# Altium footprint library myPcb.PcbLib: 80 footprints (part 3 of 5)
Each footprint in its own frame and in the unit in brackets; x right, y up, seen from the top. Pads: shape width x height; smd on the part's side, far side on the other; paste and mask are expansions set on the pad; w line width, h text height; cw(c..) or ccw(c..) is an arc to the next point about the centre after c.
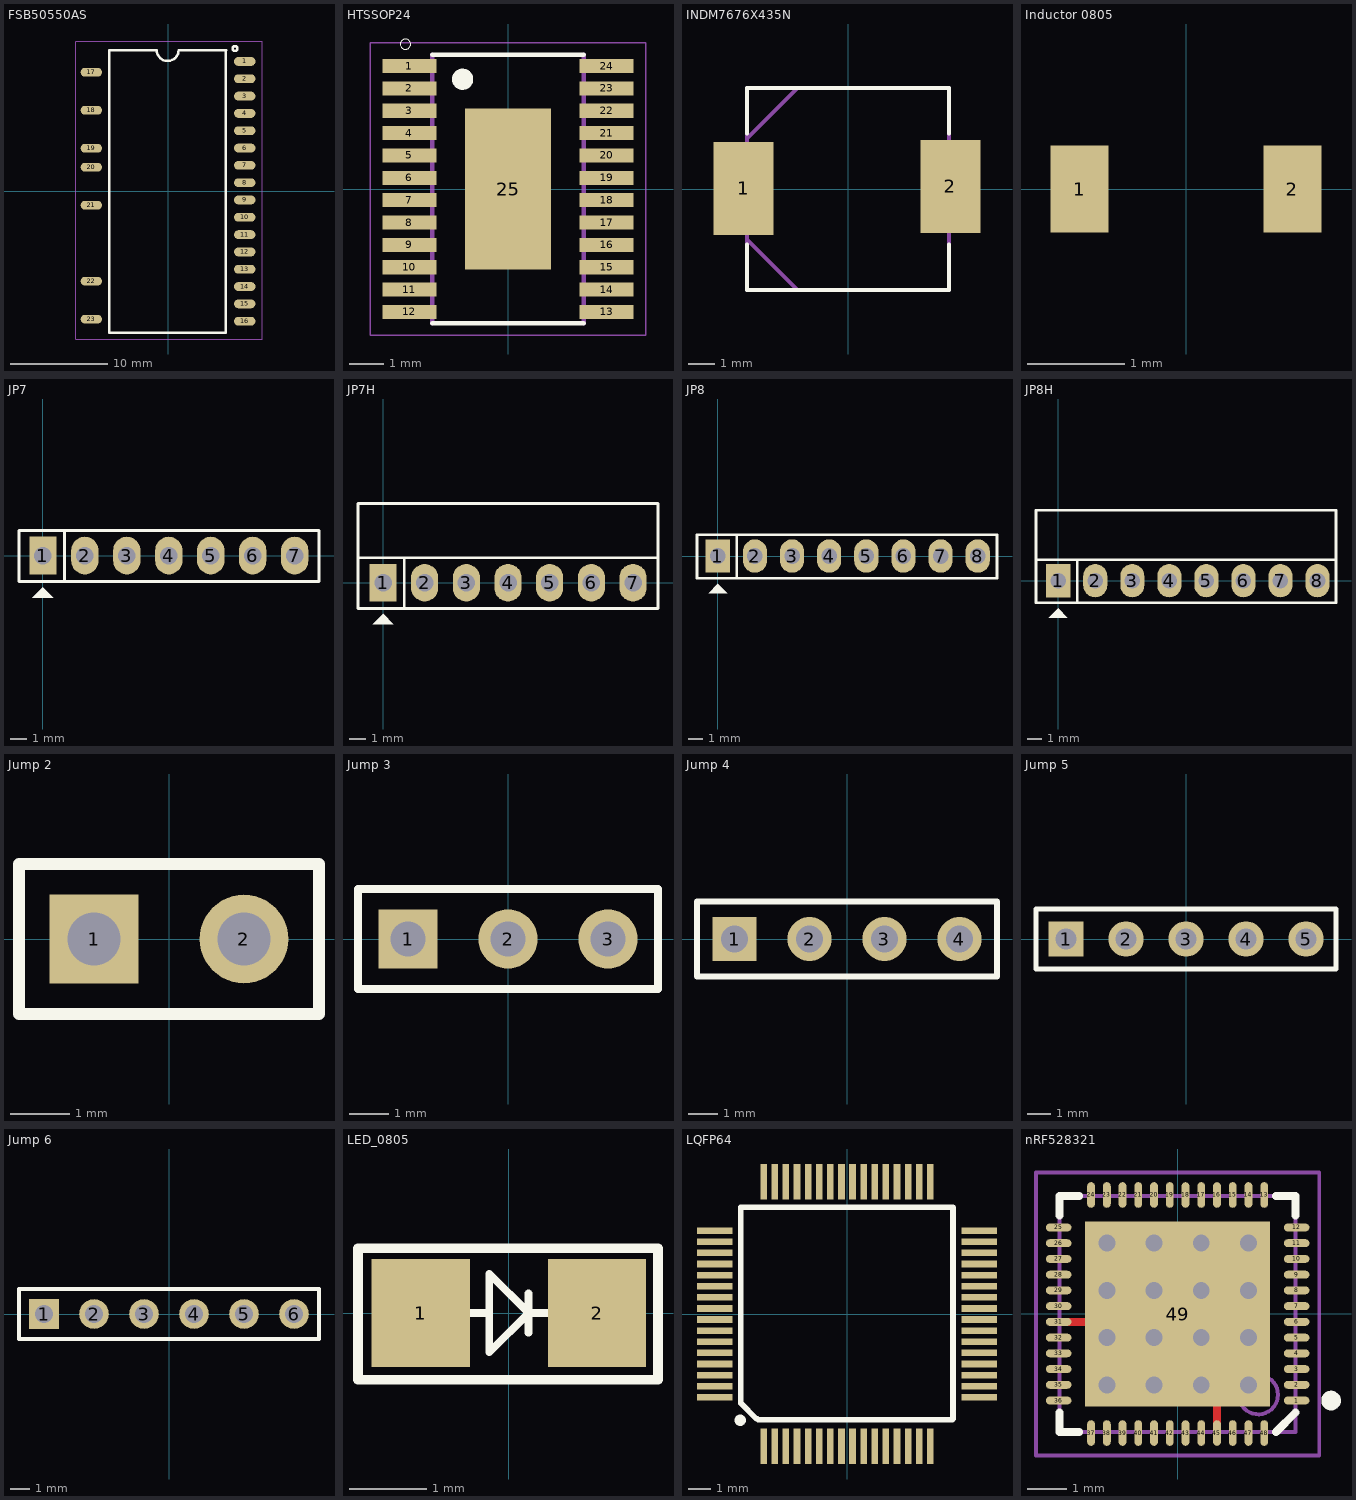
[diagram p2: the footprints below, top view; thin cyan lines are the x and y axes]

## FSB50550AS [mm]
pads (23):
  oval 2.2x0.9 smd: 1(7.874,13.335) 2(7.874,11.557) 3(7.874,9.779) 4(7.874,8.001) 5(7.874,6.223) 6(7.874,4.445) 7(7.874,2.667) 8(7.874,0.889) 9(7.874,-0.889) 10(7.874,-2.667) 11(7.874,-4.445) 12(7.874,-6.223) 13(7.874,-8.001) 14(7.874,-9.779) 15(7.874,-11.557) 16(7.874,-13.335) 17(-7.874,12.225) 18(-7.874,8.325) 19(-7.874,4.425) 20(-7.874,2.475) 21(-7.874,-1.425) 22(-7.874,-9.225) 23(-7.874,-13.125)
Top Overlay:
  circle w0.254: c6.879,14.66 r0.252
  lines w0.254: -6.051,14.5 -6.051,-14.5 5.949,-14.5 5.949,14.5 ; -6.051,14.51 -1.171,14.51 ; -1.161,14.5 ccw(c-0.036,14.516) 1.089,14.51 5.969,14.51
Mechanical 15:
  lines w0.1: -9.22,15.392 -9.423,15.392 ; -9.423,15.392 -9.449,15.367 -9.449,-15.164 9.652,-15.164 9.652,15.392 -8.788,15.392 -9.423,15.392
3D body: height 3.51, standoff -0.19, extent -8.499,-14.522 8.448,14.478

## HTSSOP24 [mm] "https://www.snapeda.com"
pads (25):
  rect 1.57x0.41 smd: 1(-2.87,3.575) 2(-2.87,2.925) 3(-2.87,2.275) 4(-2.87,1.625) 5(-2.87,0.975) 6(-2.87,0.325) 7(-2.87,-0.325) 8(-2.87,-0.975) 9(-2.87,-1.625) 10(-2.87,-2.275) 11(-2.87,-2.925) 12(-2.87,-3.575) 13(2.87,-3.575) 14(2.87,-2.925) 15(2.87,-2.275) 16(2.87,-1.625) 17(2.87,-0.975) 18(2.87,-0.325) 19(2.87,0.325) 20(2.87,0.975) 21(2.87,1.625) 22(2.87,2.275) 23(2.87,2.925) 24(2.87,3.575)
  rect 2.5x4.68 smd: 25(0,0)
Top Overlay:
  circle w0.127: c-1.32,3.19 r0.156
  circle w0.127: c-1.32,3.19 r0.11
  circle w0.127: c-1.43,3.19 r0.11
  circle w0.127: c-1.43,3.19 r0.11
  circle w0.127: c-1.32,3.19 r0.246
  circle w0: c-2.98,4.21 r0.15
  lines w0.127: -2.2,-3.9 2.2,-3.9 ; -2.2,3.9 2.2,3.9
Top Paste:
  region: -0.11,0.16 -1.15,0.16 -1.15,1.11 -0.11,1.11
  region: 0.16,-0.11 0.79,-0.11 0.79,-1.612 0.16,-1.612
  region: -1.148,-0.11 -0.11,-0.11 -0.11,-1.613 -1.148,-1.613
  region: 0.16,1.11 0.79,1.11 0.79,0.16 0.16,0.16
Mechanical 1:
  lines w0.05: -4,-4.25 4,-4.25 4,4.25 -4,4.25 -4,-4.25
  lines w0.127: -2.2,-3.9 -2.2,3.9 ; 2.2,-3.9 2.2,3.9
3D body: height 1.06, standoff -0.14, extent -3.278,-3.95 3.278,3.95

## INDM7676X435N [mil]
pads (2):
  rect 89x138 smd: 1(-155,1) 2(152,4)
Top Overlay:
  lines w6: -150,-82 -150,-150 150,-150 150,-82 ; -150,82 -150,150 150,150 150,82
Mechanical 1:
  lines w6: -150,-75 -75,-150 ; -150,75 -75,150 ; -150,-150 150,-150 150,150 -150,150 -150,-150
3D body: height 118.59, standoff -21.17, extent -148.61,-148.21 150.61,151

## Inductor 0805 [mm]
pads (2):
  rect 0.6x0.9 smd: 1(-1.1,0) 2(1.1,0)
3D body: height 0.95, standoff 0, extent -1,-0.6 1,0.6

## JP7 [mil] "JP7"
height 200
pads (7):
  rect 65x90 hole 42: 1(0,0)
  oval 65x90 hole 42: 2(100,0) 3(200,0) 4(300,0) 5(400,0) 6(500,0) 7(600,0)
Top Overlay:
  region: 0,-75 -25,-100 25,-100
  lines w7: 51,-58 51,60 ; -57,-62 -57,60 658,60 658,-62 -57,-62
3D body: height 323.44, standoff -117.51, extent -50,-49.21 646.06,49.21

## JP7H [mil]
height 200
pads (7):
  rect 65x90 hole 42: 1(0,0)
  oval 65x90 hole 42: 2(100,0) 3(200,0) 4(300,0) 5(400,0) 6(500,0) 7(600,0)
Top Overlay:
  region: 0,-75 -25,-100 25,-100
  lines w7: -57,60 660,60 ; -50,60 -60,60 ; 51,-58 51,60 ; -60,60 -60,190 660,190 660,60 ; -60,60 -60,-62 660,-62 660,60
3D body: height 99.03, standoff -93.89, extent -46.06,-24.96 646.07,413.63

## JP8 [mil] "JP8"
height 200
pads (8):
  rect 65x90 hole 42: 1(0,0)
  oval 65x90 hole 42: 2(100,0) 3(200,0) 4(300,0) 5(400,0) 6(500,0) 7(600,0) 8(700,0)
Top Overlay:
  region: 0,-75 -25,-100 25,-100
  lines w7: 51,-60 51,56 ; -56,-60 752,-60 752,57 -56,57 -56,-60
3D body: height 323.43, standoff -117.51, extent -48.03,-50 748.03,48.43

## JP8H [mil]
height 200
pads (8):
  rect 65x90 hole 42: 1(0,0)
  oval 65x90 hole 42: 2(100,0) 3(200,0) 4(300,0) 5(400,0) 6(500,0) 7(600,0) 8(700,0)
Top Overlay:
  region: 0,-75 -25,-100 25,-100
  lines w7: 51,-60 51,56 ; -60,57 -60,190 750,190 750,57 ; -60,57 750,57 ; -60,57 -60,-60 750,-60 750,57
3D body: height 49.21, standoff -143.7, extent -46.06,-14.96 746.06,423.62

## Jump 2 [mm] "Jump 2P 2.54"
height 1.5
pads (2):
  rect 1.5x1.5 hole 0.9: 1(-1.27,0)
  round 1.5 hole 0.9: 2(1.27,0)
Top Overlay:
  lines w0.2: -2.54,-1.27 -2.54,1.27 2.54,1.27 2.54,-1.27 -2.54,-1.27
3D body: height 1.5, standoff 0, extent 0,-1.27 2.54,1.27
3D body: height 7, standoff -1, extent 0.864,-0.406 1.66,0.392
3D body: height 7, standoff -1, extent -1.676,-0.406 -0.88,0.392
3D body: height 1.5, standoff 0, extent -2.54,-1.27 0,1.27

## Jump 3 [mm] "Jump 3P 2.54"
height 15.24
pads (3):
  rect 1.5x1.5 hole 0.9: 1(-2.54,0)
  round 1.5 hole 0.9: 2(0,0) 3(2.54,0)
Top Overlay:
  lines w0.2: -3.81,-1.27 -3.81,1.27 ; -3.81,-1.27 3.81,-1.27 3.81,1.27 -3.81,1.27 ; -3.81,-1.27 -3.81,1.27
3D body: height 7, standoff -1, extent 2.134,-0.406 2.93,0.392
3D body: height 1.5, standoff 0, extent 1.27,-1.27 3.81,1.27
3D body: height 7, standoff -1, extent -0.406,-0.406 0.39,0.392
3D body: height 1.5, standoff 0, extent -1.27,-1.27 1.27,1.27
3D body: height 7, standoff -1, extent -2.946,-0.406 -2.15,0.392
3D body: height 1.5, standoff 0, extent -3.81,-1.27 -1.27,1.27

## Jump 4 [mm]
height 2.27
pads (4):
  rect 1.5x1.5 hole 0.9: 1(-3.81,0)
  round 1.5 hole 0.9: 2(-1.27,0) 3(1.27,0) 4(3.81,0)
Top Overlay:
  lines w0.2: -5.08,-1.27 5.08,-1.27 5.08,1.27 -5.08,1.27 -5.08,-1.27
3D body: height 1.5, standoff 0, extent 2.54,-1.27 5.08,1.27
3D body: height 7, standoff -1, extent 3.404,-0.406 4.2,0.392
3D body: height 1.5, standoff 0, extent 0,-1.27 2.54,1.27
3D body: height 7, standoff -1, extent 0.864,-0.406 1.66,0.392
3D body: height 1.5, standoff 0, extent -2.54,-1.27 0,1.27
3D body: height 7, standoff -1, extent -1.676,-0.406 -0.88,0.392
3D body: height 1.5, standoff 0, extent -5.08,-1.27 -2.54,1.27
3D body: height 7, standoff -1, extent -4.216,-0.406 -3.42,0.392

## Jump 5 [mm]
height 15.24
pads (5):
  rect 1.5x1.5 hole 0.9: 1(-5.08,0)
  round 1.5 hole 0.9: 2(-2.54,0) 3(0,0) 4(2.54,0) 5(5.08,0)
Top Overlay:
  lines w0.2: -6.35,-1.27 -6.35,1.27 6.35,1.27 6.35,-1.27 -6.35,-1.27
3D body: height 7, standoff -1, extent -5.486,-0.406 -4.69,0.392
3D body: height 1.5, standoff 0, extent -6.35,-1.27 -3.81,1.27
3D body: height 7, standoff -1, extent -2.946,-0.406 -2.15,0.392
3D body: height 1.5, standoff 0, extent -3.81,-1.27 -1.27,1.27
3D body: height 7, standoff -1, extent -0.406,-0.406 0.39,0.392
3D body: height 1.5, standoff 0, extent -1.27,-1.27 1.27,1.27
3D body: height 7, standoff -1, extent 2.134,-0.406 2.93,0.392
3D body: height 1.5, standoff 0, extent 1.27,-1.27 3.81,1.27
3D body: height 7, standoff -1, extent 4.674,-0.406 5.47,0.392
3D body: height 1.5, standoff 0, extent 3.81,-1.27 6.35,1.27

## Jump 6 [mm]
height 15.24
pads (6):
  rect 1.5x1.5 hole 0.9: 1(-6.35,0)
  round 1.5 hole 0.9: 2(-3.81,0) 3(-1.27,0) 4(1.27,0) 5(3.81,0) 6(6.35,0)
Top Overlay:
  lines w0.2: -7.62,-1.27 -7.62,1.27 7.62,1.27 7.62,-1.27 -7.62,-1.27
3D body: height 1.5, standoff 0, extent 2.54,-1.27 5.08,1.27
3D body: height 7, standoff -1, extent 3.404,-0.406 4.2,0.392
3D body: height 1.5, standoff 0, extent 0,-1.27 2.54,1.27
3D body: height 7, standoff -1, extent 0.864,-0.406 1.66,0.392
3D body: height 1.5, standoff 0, extent -2.54,-1.27 0,1.27
3D body: height 7, standoff -1, extent -1.676,-0.406 -0.88,0.392
3D body: height 1.5, standoff 0, extent -5.08,-1.27 -2.54,1.27
3D body: height 7, standoff -1, extent -4.216,-0.406 -3.42,0.392
3D body: height 1.5, standoff 0, extent -7.62,-1.27 -5.08,1.27
3D body: height 7, standoff -1, extent -6.756,-0.406 -5.96,0.392
3D body: height 1.5, standoff 0, extent 5.08,-1.27 7.62,1.27
3D body: height 7, standoff -1, extent 5.944,-0.406 6.74,0.392

## LED_0805 [mil]
height 70.87
pads (2):
  rect 50x55 smd: 1(-45,0) 2(45,0)
Top Overlay:
  lines w3.94: -20,0 -10,0 ; 10,-10 10,10 ; 20,0 10,0 ; 10,0 -10,-20 -10,20 10,0
  lines w5: -77,-34 76,-34 76,33 -77,33 -77,-34
3D body: height 33.45, standoff 0.23, extent -40.6,-15.68 40.6,20

## LQFP64 [mm] "LQFP64"
height 2.27
pads (64):
  rect 0.3x1.6 smd: 1(-3.75,-5.95) 2(-3.25,-5.95) 3(-2.75,-5.95) 4(-2.25,-5.95) 5(-1.75,-5.95) 6(-1.25,-5.95) 7(-0.75,-5.95) 8(-0.25,-5.95) 9(0.25,-5.95) 10(0.75,-5.95) 11(1.25,-5.95) 12(1.75,-5.95) 13(2.25,-5.95) 14(2.75,-5.95) 15(3.25,-5.95) 16(3.75,-5.95) 33(3.75,5.95) 34(3.25,5.95) 35(2.75,5.95) 36(2.25,5.95) 37(1.75,5.95) 38(1.25,5.95) 39(0.75,5.95) 40(0.25,5.95) 41(-0.25,5.95) 42(-0.75,5.95) 43(-1.25,5.95) 44(-1.75,5.95) 45(-2.25,5.95) 46(-2.75,5.95) 47(-3.25,5.95) 48(-3.75,5.95)
  rect 1.6x0.3 smd: 17(5.95,-3.75) 18(5.95,-3.25) 19(5.95,-2.75) 20(5.95,-2.25) 21(5.95,-1.75) 22(5.95,-1.25) 23(5.95,-0.75) 24(5.95,-0.25) 25(5.95,0.25) 26(5.95,0.75) 27(5.95,1.25) 28(5.95,1.75) 29(5.95,2.25) 30(5.95,2.75) 31(5.95,3.25) 32(5.95,3.75) 49(-5.95,3.75) 50(-5.95,3.25) 51(-5.95,2.75) 52(-5.95,2.25) 53(-5.95,1.75) 54(-5.95,1.25) 55(-5.95,0.75) 56(-5.95,0.25) 57(-5.95,-0.25) 58(-5.95,-0.75) 59(-5.95,-1.25) 60(-5.95,-1.75) 61(-5.95,-2.25) 62(-5.95,-2.75) 63(-5.95,-3.25) 64(-5.95,-3.75)
Top Overlay:
  lines w0.254: -4.779,4.639 -4.779,4.804 4.67,4.804 4.759,4.804 4.772,4.791 4.772,-4.721 4.734,-4.759 -3.991,-4.759 ; -4.779,4.778 -4.779,-4.01 -4.068,-4.721 -4.042,-4.721
  lines w0.508: -4.817,-4.785 -4.804,-4.785
3D body: height 1.46, standoff -0.14, extent -6.016,-6.004 5.984,5.996

## nRF528321 [mm]
height 1.27
pads (49):
  oval 0.65x0.2 smd: 1(3.025,-2.2) 2(3.025,-1.8) 3(3.025,-1.4) 4(3.025,-1) 5(3.025,-0.6) 6(3.025,-0.2) 7(3.025,0.2) 8(3.025,0.6) 9(3.025,1) 10(3.025,1.4) 11(3.025,1.8) 12(3.025,2.2) 25(-3.025,2.2) 26(-3.025,1.8) 27(-3.025,1.4) 28(-3.025,1) 29(-3.025,0.6) 30(-3.025,0.2) 31(-3.025,-0.2) 32(-3.025,-0.6) 33(-3.025,-1) 34(-3.025,-1.4) 35(-3.025,-1.8) 36(-3.025,-2.2)
  oval 0.2x0.65 smd: 13(2.2,3.025) 14(1.8,3.025) 15(1.4,3.025) 16(1,3.025) 17(0.6,3.025) 18(0.2,3.025) 19(-0.2,3.025) 20(-0.6,3.025) 21(-1,3.025) 22(-1.4,3.025) 23(-1.8,3.025) 24(-2.2,3.025) 37(-2.2,-3.025) 38(-1.8,-3.025) 39(-1.4,-3.025) 40(-1,-3.025) 41(-0.6,-3.025) 42(-0.2,-3.025) 43(0.2,-3.025) 44(0.6,-3.025) 45(1,-3.025) 46(1.4,-3.025) 47(1.8,-3.025) 48(2.2,-3.025)
  rect 4.7x4.7 smd: 49(0,0)
via 1.8,-1.8 diameter 0.66 hole 0.43
via 0.6,-1.8 diameter 0.66 hole 0.43
via -0.6,-1.8 diameter 0.66 hole 0.43
via -1.8,-1.8 diameter 0.66 hole 0.43
via 1.8,-0.6 diameter 0.66 hole 0.43
via 0.6,-0.6 diameter 0.66 hole 0.43
via -0.6,-0.6 diameter 0.66 hole 0.43
via -1.8,-0.6 diameter 0.66 hole 0.43
via 1.8,0.6 diameter 0.66 hole 0.43
via 0.6,0.6 diameter 0.66 hole 0.43
via -0.6,0.6 diameter 0.66 hole 0.43
via -1.8,0.6 diameter 0.66 hole 0.43
via 1.8,1.8 diameter 0.66 hole 0.43
via 0.6,1.8 diameter 0.66 hole 0.43
via -0.6,1.8 diameter 0.66 hole 0.43
via -1.8,1.8 diameter 0.66 hole 0.43
Top Layer:
  lines w0.2: -3.025,-0.2 -2.025,-0.2 ; 1,-3.025 1,-1.8 1,-1.625
  lines w0.254: -2.025,-0.2 -1.889,-0.064
Top Overlay:
  circle w0.25: c3.9,-2.2 r0.125
  lines w0.2: -3,-2.5 -3,-3 -2.5,-3 ; -3,2.5 -3,3 -2.5,3 ; 2.5,-3 3,-2.5 ; 2.5,3 3,3 3,2.5
Mechanical 13:
  circle w0.1: c2.05,-2.05 r0.5
  lines w0.1: -3,-3 -3,3 3,3 3,-3 -3,-3
Mechanical 15:
  lines w0.1: -0.5,0 0.5,0 ; 0,-0.5 0,0.5 ; -3.6,-3.6 -3.6,3.6 3.6,3.6 3.6,-3.6 -3.6,-3.6
3D body: height 0.86, standoff -0.01, extent -3.02,-3.02 3.02,3.02